# Altium integrated library LEMO Unipole And Multipole Type Connectors.IntLib: 1566 symbols (part 1 of 13) (continued)
## ECG.0B.305.CLV
designator J?
Fixed receptacle with two nuts, with elbow contact for printed circuit (back panel mounting), Key (G), 0B series, Multipole Type with 5 Contacts; Manufacturer: LEMO; PartNumber: ECG.0B.305.CLV; Number of contacts: 5; Contact Diameter: 0.7 mm; AWG: 24; Rated Current(A): 6; DatasheetVersion: Jun-14; PackageReference: ECG.0B.305.CLV; PackageDescription: Fixed receptacle with two nuts, with elbow contact for printed circuit (back panel mounting), Key(G) for Printed Circuit; Supplier 1: Mouser; Supplier Part Number 1: 736-ECG0B305CLV; Supplier 2: Newark; Supplier Part Number 2: 27T7344; Supplier 3: Farnell; Supplier Part Number 3: 9267026; Supplier 4: Digi-Key; Supplier Part Number 4: ECG.0B.305.CLV-ND; ComponentLink1Description: Manufacturer URL; ComponentLink1URL: http://www.lemo.com; ComponentLink2Description: Datasheet; ComponentLink2URL: http://intra.lemo.ch/catalog/ROW/UK_English/unipole_multipole.pdf
footprint ECG.0B.305.CLV (Socket, Female, Body 9mm dia. Height 18.3 mm, Through hole)
pins: 1, 2, 3, 4, 5

## ECG.0B.306.CLN
designator J?
Fixed receptacle with two nuts and straight contact for printed circuit (back panel mounting), Key (G), 0B series, Multipole Type with 6 Contacts; Manufacturer: LEMO; PartNumber: ECG.0B.306.CLN; Number of contacts: 6; Contact Diameter: 0.5 mm; AWG: 28; Rated Current(A): 2.5; DatasheetVersion: Jun-14; PackageReference: ECG.0B.306.CLN; PackageDescription: Fixed receptacle with two nuts and straight contact for printed circuit (back panel mounting), Key(G) for Printed Circuit; Supplier 1: Mouser; Supplier Part Number 1: 736-ECG0B306CLN; Supplier 2: Newark; Supplier Part Number 2: 68R6320; Supplier 3: Digi-Key; Supplier Part Number 3: ECG.0B.306.CLN-ND; ComponentLink1Description: Manufacturer URL; ComponentLink1URL: http://www.lemo.com; ComponentLink2Description: Datasheet; ComponentLink2URL: http://intra.lemo.ch/catalog/ROW/UK_English/unipole_multipole.pdf
footprint ECG.0B.306.CLN (Socket, Female, Body 9mm dia. Height 16.4 mm, Through hole)
pins: 1, 2, 3, 4, 5, 6

## ECG.0B.306.CLV
designator J?
Fixed receptacle with two nuts, with elbow contact for printed circuit (back panel mounting), Key (G), 0B series, Multipole Type with 6 Contacts; Manufacturer: LEMO; PartNumber: ECG.0B.306.CLV; Number of contacts: 6; Contact Diameter: 0.5 mm; AWG: 28; Rated Current(A): 0; DatasheetVersion: Jun-14; PackageReference: ECG.0B.306.CLV; PackageDescription: Fixed receptacle with two nuts, with elbow contact for printed circuit (back panel mounting), Key(G) for Printed Circuit; Supplier 1: Mouser; Supplier Part Number 1: 736-ECG0B306CLV; Supplier 2: Digi-Key; Supplier Part Number 2: ECG.0B.306.CLV-ND; ComponentLink1Description: Manufacturer URL; ComponentLink1URL: http://www.lemo.com; ComponentLink2Description: Datasheet; ComponentLink2URL: http://intra.lemo.ch/catalog/ROW/UK_English/unipole_multipole.pdf
footprint ECG.0B.306.CLV (Socket, Female, Body 9mm dia. Height 18.3 mm, Through hole)
pins: 1, 2, 3, 4, 5, 6

## ECG.0B.307.CLN
designator J?
Fixed receptacle with two nuts and straight contact for printed circuit (back panel mounting), Key (G), 0B series, Multipole Type with 7 Contacts; Manufacturer: LEMO; PartNumber: ECG.0B.307.CLN; Number of contacts: 7; Contact Diameter: 0.5 mm; AWG: 28; Rated Current(A): 2.5; DatasheetVersion: Jun-14; PackageReference: ECG.0B.307.CLN; PackageDescription: Fixed receptacle with two nuts and straight contact for printed circuit (back panel mounting), Key(G) for Printed Circuit; Supplier 1: Mouser; Supplier Part Number 1: 736-ECG0B307CLN; Supplier 2: Newark; Supplier Part Number 2: 25R7474; Supplier 3: Digi-Key; Supplier Part Number 3: 1124-1321-ND; ComponentLink1Description: Manufacturer URL; ComponentLink1URL: http://www.lemo.com; ComponentLink2Description: Datasheet; ComponentLink2URL: http://intra.lemo.ch/catalog/ROW/UK_English/unipole_multipole.pdf
footprint ECG.0B.307.CLN (Socket, Female, Body 9mm dia. Height 16.4 mm, Through hole)
pins: 1, 2, 3, 4, 5, 6, 7

## ECG.0B.307.CLV
designator J?
Fixed receptacle with two nuts, with elbow contact for printed circuit (back panel mounting), Key (G), 0B series, Multipole Type with 7 Contacts; Manufacturer: LEMO; PartNumber: ECG.0B.307.CLV; Number of contacts: 7; Contact Diameter: 0.5 mm; AWG: 28; Rated Current(A): 0; DatasheetVersion: Jun-14; PackageReference: ECG.0B.307.CLV; PackageDescription: Fixed receptacle with two nuts, with elbow contact for printed circuit (back panel mounting), Key(G) for Printed Circuit; Supplier 1: Mouser; Supplier Part Number 1: 736-ECG0B307CLV; Supplier 2: Digi-Key; Supplier Part Number 2: ECG.0B.307.CLV-ND; ComponentLink1Description: Manufacturer URL; ComponentLink1URL: http://www.lemo.com; ComponentLink2Description: Datasheet; ComponentLink2URL: http://intra.lemo.ch/catalog/ROW/UK_English/unipole_multipole.pdf
footprint ECG.0B.307.CLV (Socket, Female, Body 9mm dia. Height 18.3 mm, Through hole)
pins: 1, 2, 3, 4, 5, 6, 7

## ECG.0B.309.CLN
designator J?
Fixed receptacle with two nuts and straight contact for printed circuit (back panel mounting), Key (G), 0B series, Multipole Type with 9 Contacts; Manufacturer: LEMO; PartNumber: ECG.0B.309.CLN; Number of contacts: 9; Contact Diameter: 0.5 mm; AWG: 28; Rated Current(A): 2; DatasheetVersion: Jun-14; PackageReference: ECG.0B.309.CLN; PackageDescription: Fixed receptacle with two nuts and straight contact for printed circuit (back panel mounting), Key(G) for Printed Circuit; Supplier 1: Mouser; Supplier Part Number 1: 736-ECG0B309CLN; Supplier 2: Newark; Supplier Part Number 2: 87R4864; Supplier 3: Digi-Key; Supplier Part Number 3: ECG.0B.309.CLN-ND; ComponentLink1Description: Manufacturer URL; ComponentLink1URL: http://www.lemo.com; ComponentLink2Description: Datasheet; ComponentLink2URL: http://intra.lemo.ch/catalog/ROW/UK_English/unipole_multipole.pdf
footprint ECG.0B.309.CLN (Socket, Female, Body 9mm dia. Height 16.4 mm, Through hole)
pins: 1, 2, 3, 4, 5, 6, 7, 8, 9

## ECG.0B.309.CLV
designator J?
Fixed receptacle with two nuts, with elbow contact for printed circuit (back panel mounting), Key (G), 0B series, Multipole Type with 9 Contacts; Manufacturer: LEMO; PartNumber: ECG.0B.309.CLV; Number of contacts: 9; Contact Diameter: 0.5 mm; AWG: 28; Rated Current(A): 0; DatasheetVersion: Jun-14; PackageReference: ECG.0B.309.CLV; PackageDescription: Fixed receptacle with two nuts, with elbow contact for printed circuit (back panel mounting), Key(G) for Printed Circuit; Supplier 1: Mouser; Supplier Part Number 1: 736-ECG0B309CLV; Supplier 2: Digi-Key; Supplier Part Number 2: ECG.0B.309.CLV-ND; ComponentLink1Description: Manufacturer URL; ComponentLink1URL: http://www.lemo.com; ComponentLink2Description: Datasheet; ComponentLink2URL: http://intra.lemo.ch/catalog/ROW/UK_English/unipole_multipole.pdf
footprint ECG.0B.309.CLV (Socket, Female, Body 9mm dia. Height 18.3 mm, Through hole)
pins: 1, 2, 3, 4, 5, 6, 7, 8, 9

## ECG.1B.302.CLN
designator J?
Fixed receptacle with two nuts and straight contact for printed circuit (back panel mounting), Key (G), 1B series, Multipole Type with 2 Contacts; Manufacturer: LEMO; PartNumber: ECG.1B.302.CLN; Number of contacts: 2; Contact Diameter: 1.3 mm; AWG: 20; Rated Current(A): 15; DatasheetVersion: Jun-14; PackageReference: ECG.1B.302.CLN; PackageDescription: Fixed receptacle with two nuts and straight contact for printed circuit (back panel mounting), Key(G) for Printed Circuit; Supplier 1: Mouser; Supplier Part Number 1: 736-ECG1B302CLN; Supplier 2: Newark; Supplier Part Number 2: 12T6405; Supplier 3: Digi-Key; Supplier Part Number 3: ECG.1B.302.CLN-ND; ComponentLink1Description: Manufacturer URL; ComponentLink1URL: http://www.lemo.com; ComponentLink2Description: Datasheet; ComponentLink2URL: http://intra.lemo.ch/catalog/ROW/UK_English/unipole_multipole.pdf
footprint ECG.1B.302.CLN (Socket, Female, Body 12mm dia. Height 19.8 mm, Through hole)
pins: 1, 2

## ECG.1B.302.CLV
designator J?
Fixed receptacle with two nuts, with elbow contact for printed circuit (back panel mounting), Key (G), 1B series, Multipole Type with 2 Contacts; Manufacturer: LEMO; PartNumber: ECG.1B.302.CLV; Number of contacts: 2; Contact Diameter: 1.3 mm; AWG: 20; Rated Current(A): 12; DatasheetVersion: Jun-14; PackageReference: ECG.1B.302.CLV; PackageDescription: Fixed receptacle with two nuts, with elbow contact for printed circuit (back panel mounting), Key(G) for Printed Circuit; Supplier 1: Mouser; Supplier Part Number 1: 736-ECG1B302CLV; Supplier 2: Digi-Key; Supplier Part Number 2: ECG.1B.302.CLV-ND; ComponentLink1Description: Manufacturer URL; ComponentLink1URL: http://www.lemo.com; ComponentLink2Description: Datasheet; ComponentLink2URL: http://intra.lemo.ch/catalog/ROW/UK_English/unipole_multipole.pdf
footprint ECG.1B.302.CLV (Socket, Female, Body 12mm dia. Height 20.3 mm, Through hole)
pins: 1, 2

## ECG.1B.303.CLN
designator J?
Fixed receptacle with two nuts and straight contact for printed circuit (back panel mounting), Key (G), 1B series, Multipole Type with 3 Contacts; Manufacturer: LEMO; PartNumber: ECG.1B.303.CLN; Number of contacts: 3; Contact Diameter: 1.3 mm; AWG: 20; Rated Current(A): 12; DatasheetVersion: Jun-14; PackageReference: ECG.1B.303.CLN; PackageDescription: Fixed receptacle with two nuts and straight contact for printed circuit (back panel mounting), Key(G) for Printed Circuit; Supplier 1: Mouser; Supplier Part Number 1: 736-ECG1B303CLN; Supplier 2: Digi-Key; Supplier Part Number 2: ECG.1B.303.CLN-ND; ComponentLink1Description: Manufacturer URL; ComponentLink1URL: http://www.lemo.com; ComponentLink2Description: Datasheet; ComponentLink2URL: http://intra.lemo.ch/catalog/ROW/UK_English/unipole_multipole.pdf
footprint ECG.1B.303.CLN (Socket, Female, Body 12mm dia. Height 19.8 mm, Through hole)
pins: 1, 2, 3

## ECG.1B.303.CLV
designator J?
Fixed receptacle with two nuts, with elbow contact for printed circuit (back panel mounting), Key (G), 1B series, Multipole Type with 3 Contacts; Manufacturer: LEMO; PartNumber: ECG.1B.303.CLV; Number of contacts: 3; Contact Diameter: 1.3 mm; AWG: 20; Rated Current(A): 0; DatasheetVersion: Jun-14; PackageReference: ECG.1B.303.CLV; PackageDescription: Fixed receptacle with two nuts, with elbow contact for printed circuit (back panel mounting), Key(G) for Printed Circuit; Supplier 1: Mouser; Supplier Part Number 1: 736-ECG1B303CLV; Supplier 2: Farnell; Supplier Part Number 2: 9267034; Supplier 3: Digi-Key; Supplier Part Number 3: ECG.1B.303.CLV-ND; ComponentLink1Description: Manufacturer URL; ComponentLink1URL: http://www.lemo.com; ComponentLink2Description: Datasheet; ComponentLink2URL: http://intra.lemo.ch/catalog/ROW/UK_English/unipole_multipole.pdf
footprint ECG.1B.303.CLV (Socket, Female, Body 12mm dia. Height 20.3 mm, Through hole)
pins: 1, 2, 3

## ECG.1B.304.CLN
designator J?
Fixed receptacle with two nuts and straight contact for printed circuit (back panel mounting), Key (G), 1B series, Multipole Type with 4 Contacts; Manufacturer: LEMO; PartNumber: ECG.1B.304.CLN; Number of contacts: 4; Contact Diameter: 0.9 mm; AWG: 22; Rated Current(A): 10; DatasheetVersion: Jun-14; PackageReference: ECG.1B.304.CLN; PackageDescription: Fixed receptacle with two nuts and straight contact for printed circuit (back panel mounting), Key(G) for Printed Circuit; Supplier 1: Mouser; Supplier Part Number 1: 736-ECG1B304CLN; Supplier 2: Newark; Supplier Part Number 2: 68R6325; Supplier 3: Digi-Key; Supplier Part Number 3: ECG.1B.304.CLN-ND; ComponentLink1Description: Manufacturer URL; ComponentLink1URL: http://www.lemo.com; ComponentLink2Description: Datasheet; ComponentLink2URL: http://intra.lemo.ch/catalog/ROW/UK_English/unipole_multipole.pdf
footprint ECG.1B.304.CLN (Socket, Female, Body 12mm dia. Height 19.8 mm, Through hole)
pins: 1, 2, 3, 4

## ECG.1B.304.CLV
designator J?
Fixed receptacle with two nuts, with elbow contact for printed circuit (back panel mounting), Key (G), 1B series, Multipole Type with 4 Contacts; Manufacturer: LEMO; PartNumber: ECG.1B.304.CLV; Number of contacts: 4; Contact Diameter: 0.9 mm; AWG: 22; Rated Current(A): 6; DatasheetVersion: Jun-14; PackageReference: ECG.1B.304.CLV; PackageDescription: Fixed receptacle with two nuts, with elbow contact for printed circuit (back panel mounting), Key(G) for Printed Circuit; Supplier 1: Mouser; Supplier Part Number 1: 736-ECG1B304CLV; Supplier 2: Farnell; Supplier Part Number 2: 9267042; Supplier 3: Digi-Key; Supplier Part Number 3: ECG.1B.304.CLV-ND; ComponentLink1Description: Manufacturer URL; ComponentLink1URL: http://www.lemo.com; ComponentLink2Description: Datasheet; ComponentLink2URL: http://intra.lemo.ch/catalog/ROW/UK_English/unipole_multipole.pdf
footprint ECG.1B.304.CLV (Socket, Female, Body 12mm dia. Height 20.3 mm, Through hole)
pins: 1, 2, 3, 4

## ECG.1B.305.CLN
designator J?
Fixed receptacle with two nuts and straight contact for printed circuit (back panel mounting), Key (G), 1B series, Multipole Type with 5 Contacts; Manufacturer: LEMO; PartNumber: ECG.1B.305.CLN; Number of contacts: 5; Contact Diameter: 0.9 mm; AWG: 22; Rated Current(A): 9; DatasheetVersion: Jun-14; PackageReference: ECG.1B.305.CLN; PackageDescription: Fixed receptacle with two nuts and straight contact for printed circuit (back panel mounting), Key(G) for Printed Circuit; Supplier 1: Mouser; Supplier Part Number 1: 736-ECG1B305CLN; Supplier 2: Newark; Supplier Part Number 2: 25R7475; Supplier 3: Digi-Key; Supplier Part Number 3: ECG.1B.305.CLN-ND; ComponentLink1Description: Manufacturer URL; ComponentLink1URL: http://www.lemo.com; ComponentLink2Description: Datasheet; ComponentLink2URL: http://intra.lemo.ch/catalog/ROW/UK_English/unipole_multipole.pdf
footprint ECG.1B.305.CLN (Socket, Female, Body 12mm dia. Height 19.8 mm, Through hole)
pins: 1, 2, 3, 4, 5

## ECG.1B.305.CLV
designator J?
Fixed receptacle with two nuts, with elbow contact for printed circuit (back panel mounting), Key (G), 1B series, Multipole Type with 5 Contacts; Manufacturer: LEMO; PartNumber: ECG.1B.305.CLV; Number of contacts: 5; Contact Diameter: 0.9 mm; AWG: 22; Rated Current(A): 6; DatasheetVersion: Jun-14; PackageReference: ECG.1B.305.CLV; PackageDescription: Fixed receptacle with two nuts, with elbow contact for printed circuit (back panel mounting), Key(G) for Printed Circuit; Supplier 1: Mouser; Supplier Part Number 1: 736-ECG1B305CLV; Supplier 2: Digi-Key; Supplier Part Number 2: ECG.1B.305.CLV-ND; ComponentLink1Description: Manufacturer URL; ComponentLink1URL: http://www.lemo.com; ComponentLink2Description: Datasheet; ComponentLink2URL: http://intra.lemo.ch/catalog/ROW/UK_English/unipole_multipole.pdf
footprint ECG.1B.305.CLV (Socket, Female, Body 12mm dia. Height 20.3 mm, Through hole)
pins: 1, 2, 3, 4, 5

## ECG.1B.306.CLN
designator J?
Fixed receptacle with two nuts and straight contact for printed circuit (back panel mounting), Key (G), 1B series, Multipole Type with 6 Contacts; Manufacturer: LEMO; PartNumber: ECG.1B.306.CLN; Number of contacts: 6; Contact Diameter: 0.7 mm; AWG: 24; Rated Current(A): 7; DatasheetVersion: Jun-14; PackageReference: ECG.1B.306.CLN; PackageDescription: Fixed receptacle with two nuts and straight contact for printed circuit (back panel mounting), Key(G) for Printed Circuit; Supplier 1: Mouser; Supplier Part Number 1: 736-ECG1B306CLN; Supplier 2: Newark; Supplier Part Number 2: 12T6407; Supplier 3: Digi-Key; Supplier Part Number 3: ECG.1B.306.CLN-ND; ComponentLink1Description: Manufacturer URL; ComponentLink1URL: http://www.lemo.com; ComponentLink2Description: Datasheet; ComponentLink2URL: http://intra.lemo.ch/catalog/ROW/UK_English/unipole_multipole.pdf
footprint ECG.1B.306.CLN (Socket, Female, Body 12mm dia. Height 19.8 mm, Through hole)
pins: 1, 2, 3, 4, 5, 6

## ECG.1B.306.CLV
designator J?
Fixed receptacle with two nuts, with elbow contact for printed circuit (back panel mounting), Key (G), 1B series, Multipole Type with 6 Contacts; Manufacturer: LEMO; PartNumber: ECG.1B.306.CLV; Number of contacts: 6; Contact Diameter: 0.7 mm; AWG: 24; DatasheetVersion: Jun-14; PackageReference: ECG.1B.306.CLV; PackageDescription: Fixed receptacle with two nuts, with elbow contact for printed circuit (back panel mounting), Key(G) for Printed Circuit; Supplier 1: Mouser; Supplier Part Number 1: 736-ECG1B306CLV; Supplier 2: Farnell; Supplier Part Number 2: 9267050; Supplier 3: Digi-Key; Supplier Part Number 3: 1124-1324-ND; Rated Current(A): 6; ComponentLink1Description: Manufacturer URL; ComponentLink1URL: http://www.lemo.com; ComponentLink2Description: Datasheet; ComponentLink2URL: http://intra.lemo.ch/catalog/ROW/UK_English/unipole_multipole.pdf
footprint ECG.1B.306.CLV (Socket, Female, Body 12mm dia. Height 20.3 mm, Through hole)
pins: 1, 2, 3, 4, 5, 6

## ECG.1B.307.CLN
designator J?
Fixed receptacle with two nuts and straight contact for printed circuit (back panel mounting), Key (G), 1B series, Multipole Type with 7 Contacts; Manufacturer: LEMO; PartNumber: ECG.1B.307.CLN; Number of contacts: 7; Contact Diameter: 0.7 mm; AWG: 24; DatasheetVersion: Jun-14; PackageReference: ECG.1B.307.CLN; PackageDescription: Fixed receptacle with two nuts and straight contact for printed circuit (back panel mounting), Key(G) for Printed Circuit; Supplier 1: Mouser; Supplier Part Number 1: 736-ECG1B307CLN; Supplier 2: Newark; Supplier Part Number 2: 80R0501; Supplier 3: Digi-Key; Supplier Part Number 3: 1124-1325-ND; Rated Current(A): 7; ComponentLink1Description: Manufacturer URL; ComponentLink1URL: http://www.lemo.com; ComponentLink2Description: Datasheet; ComponentLink2URL: http://intra.lemo.ch/catalog/ROW/UK_English/unipole_multipole.pdf
footprint ECG.1B.307.CLN (Socket, Female, Body 12mm dia. Height 19.8 mm, Through hole)
pins: 1, 2, 3, 4, 5, 6, 7

## ECG.1B.307.CLV
designator J?
Fixed receptacle with two nuts, with elbow contact for printed circuit (back panel mounting), Key (G), 1B series, Multipole Type with 7 Contacts; Manufacturer: LEMO; PartNumber: ECG.1B.307.CLV; Number of contacts: 7; Contact Diameter: 0.7 mm; AWG: 24; Rated Current(A): 6; DatasheetVersion: Jun-14; PackageReference: ECG.1B.307.CLV; PackageDescription: Fixed receptacle with two nuts, with elbow contact for printed circuit (back panel mounting), Key(G) for Printed Circuit; Supplier 1: Mouser; Supplier Part Number 1: 736-ECG1B307CLV; Supplier 2: Digi-Key; Supplier Part Number 2: ECG.1B.307.CLV-ND; ComponentLink1Description: Manufacturer URL; ComponentLink1URL: http://www.lemo.com; ComponentLink2Description: Datasheet; ComponentLink2URL: http://intra.lemo.ch/catalog/ROW/UK_English/unipole_multipole.pdf
footprint ECG.1B.307.CLV (Socket, Female, Body 12mm dia. Height 20.3 mm, Through hole)
pins: 1, 2, 3, 4, 5, 6, 7

## ECG.1B.308.CLN
designator J?
Fixed receptacle with two nuts and straight contact for printed circuit (back panel mounting), Key (G), 1B series, Multipole Type with 8 Contacts; Manufacturer: LEMO; PartNumber: ECG.1B.308.CLN; Number of contacts: 8; Contact Diameter: 0.7 mm; AWG: 24; Rated Current(A): 5; DatasheetVersion: Jun-14; PackageReference: ECG.1B.308.CLN; PackageDescription: Fixed receptacle with two nuts and straight contact for printed circuit (back panel mounting), Key(G) for Printed Circuit; Supplier 1: Mouser; Supplier Part Number 1: 736-ECG1B308CLN; Supplier 2: Newark; Supplier Part Number 2: 68R6330; Supplier 3: Digi-Key; Supplier Part Number 3: 1124-1326-ND; ComponentLink1Description: Manufacturer URL; ComponentLink1URL: http://www.lemo.com; ComponentLink2Description: Datasheet; ComponentLink2URL: http://intra.lemo.ch/catalog/ROW/UK_English/unipole_multipole.pdf
footprint ECG.1B.308.CLN (Socket, Female, Body 12mm dia. Height 19.8 mm, Through hole)
pins: 1, 2, 3, 4, 5, 6, 7, 8

## ECG.1B.308.CLV
designator J?
Fixed receptacle with two nuts, with elbow contact for printed circuit (back panel mounting), Key (G), 1B series, Multipole Type with 8 Contacts; Manufacturer: LEMO; PartNumber: ECG.1B.308.CLV; Number of contacts: 8; Contact Diameter: 0.7 mm; AWG: 24; Rated Current(A): 0; DatasheetVersion: Jun-14; PackageReference: ECG.1B.308.CLV; PackageDescription: Fixed receptacle with two nuts, with elbow contact for printed circuit (back panel mounting), Key(G) for Printed Circuit; Supplier 1: Mouser; Supplier Part Number 1: 736-ECG1B308CLV; Supplier 2: Digi-Key; Supplier Part Number 2: ECG.1B.308.CLV-ND; ComponentLink1Description: Manufacturer URL; ComponentLink1URL: http://www.lemo.com; ComponentLink2Description: Datasheet; ComponentLink2URL: http://intra.lemo.ch/catalog/ROW/UK_English/unipole_multipole.pdf
footprint ECG.1B.308.CLV (Socket, Female, Body 12mm dia. Height 20.3 mm, Through hole)
pins: 1, 2, 3, 4, 5, 6, 7, 8

## ECG.1B.310.CLN
designator J?
Fixed receptacle with two nuts and straight contact for printed circuit (back panel mounting), Key (G), 1B series, Multipole Type with 10 Contacts; Manufacturer: LEMO; PartNumber: ECG.1B.310.CLN; Number of contacts: 10; Contact Diameter: 0.5 mm; AWG: 28; Rated Current(A): 2.5; DatasheetVersion: Jun-14; PackageReference: ECG.1B.310.CLN; PackageDescription: Fixed receptacle with two nuts and straight contact for printed circuit (back panel mounting), Key(G) for Printed Circuit; Supplier 1: Mouser; Supplier Part Number 1: 736-ECG1B310CLN; Supplier 2: Newark; Supplier Part Number 2: 68R6331; Supplier 3: Digi-Key; Supplier Part Number 3: ECG.1B.310.CLN-ND; ComponentLink1Description: Manufacturer URL; ComponentLink1URL: http://www.lemo.com; ComponentLink2Description: Datasheet; ComponentLink2URL: http://intra.lemo.ch/catalog/ROW/UK_English/unipole_multipole.pdf
footprint ECG.1B.310.CLN (Socket, Female, Body 12mm dia. Height 19.8 mm, Through hole)
pins: 1, 2, 3, 4, 5, 6, 7, 8, 9, 10

## ECG.1B.314.CLN
designator J?
Fixed receptacle with two nuts and straight contact for printed circuit (back panel mounting), Key (G), 1B series, Multipole Type with 14 Contacts; Manufacturer: LEMO; PartNumber: ECG.1B.314.CLN; Number of contacts: 14; Contact Diameter: 0.5 mm; AWG: 28; Rated Current(A): 2; DatasheetVersion: Jun-14; PackageReference: ECG.1B.314.CLN; PackageDescription: Fixed receptacle with two nuts and straight contact for printed circuit (back panel mounting), Key(G) for Printed Circuit; Supplier 1: Mouser; Supplier Part Number 1: 736-ECG1B314CLN; Supplier 2: Digi-Key; Supplier Part Number 2: ECG.1B.314.CLN-ND; ComponentLink1Description: Manufacturer URL; ComponentLink1URL: http://www.lemo.com; ComponentLink2Description: Datasheet; ComponentLink2URL: http://intra.lemo.ch/catalog/ROW/UK_English/unipole_multipole.pdf
footprint ECG.1B.314.CLN (Socket, Female, Body 12mm dia. Height 19.8 mm, Through hole)
pins: 1, 2, 3, 4, 5, 6, 7, 8, 9, 10, 11, 12, 13, 14

## ECG.1B.316.CLN
designator J?
Fixed receptacle with two nuts and straight contact for printed circuit (back panel mounting), Key (G), 1B series, Multipole Type with 16 Contacts; Manufacturer: LEMO; PartNumber: ECG.1B.316.CLN; Number of contacts: 16; Contact Diameter: 0.5 mm; AWG: 28; Rated Current(A): 1.5; DatasheetVersion: Jun-14; PackageReference: ECG.1B.316.CLN; PackageDescription: Fixed receptacle with two nuts and straight contact for printed circuit (back panel mounting), Key(G) for Printed Circuit; Supplier 1: Mouser; Supplier Part Number 1: 736-ECG1B316CLN; Supplier 2: Digi-Key; Supplier Part Number 2: ECG.1B.316.CLN-ND; ComponentLink1Description: Manufacturer URL; ComponentLink1URL: http://www.lemo.com; ComponentLink2Description: Datasheet; ComponentLink2URL: http://intra.lemo.ch/catalog/ROW/UK_English/unipole_multipole.pdf
footprint ECG.1B.316.CLN (Socket, Female, Body 12mm dia. Height 19.8 mm, Through hole)
pins: 1, 2, 3, 4, 5, 6, 7, 8, 9, 10, 11, 12, 13, 14, 15, 16

## ECG.2B.302.CLN
designator J?
Fixed receptacle with two nuts and straight contact for printed circuit (back panel mounting), Key (G), 2B series, Multipole Type with 2 Contacts; Manufacturer: LEMO; PartNumber: ECG.2B.302.CLN; Number of contacts: 2; Contact Diameter: 2 mm; AWG: 14; Rated Current(A): 25; DatasheetVersion: Jun-14; PackageReference: ECG.2B.302.CLN; PackageDescription: Fixed receptacle with two nuts and straight contact for printed circuit (back panel mounting), Key(G) for Printed Circuit; Supplier 1: Mouser; Supplier Part Number 1: 736-ECG2B302CLN; Supplier 2: Digi-Key; Supplier Part Number 2: ECG.2B.302.CLN-ND; ComponentLink1Description: Manufacturer URL; ComponentLink1URL: http://www.lemo.com; ComponentLink2Description: Datasheet; ComponentLink2URL: http://intra.lemo.ch/catalog/ROW/UK_English/unipole_multipole.pdf
footprint ECG.2B.302.CLN (Socket, Female, Body 15mm dia. Height 21.8 mm, Through hole)
pins: 1, 2

## ECG.2B.302.CLV
designator J?
Fixed receptacle with two nuts, with elbow contact for printed circuit (back panel mounting), Key (G), 2B series, Multipole Type with 2 Contacts; Manufacturer: LEMO; PartNumber: ECG.2B.302.CLV; Number of contacts: 2; Contact Diameter: 2 mm; AWG: 14; Rated Current(A): 12; DatasheetVersion: Jun-14; PackageReference: ECG.2B.302.CLV; PackageDescription: Fixed receptacle with two nuts, with elbow contact for printed circuit (back panel mounting), Key(G) for Printed Circuit; Supplier 1: Mouser; Supplier Part Number 1: 736-ECG2B302CLV; Supplier 2: Digi-Key; Supplier Part Number 2: ECG.2B.302.CLV-ND; ComponentLink1Description: Manufacturer URL; ComponentLink1URL: http://www.lemo.com; ComponentLink2Description: Datasheet; ComponentLink2URL: http://intra.lemo.ch/catalog/ROW/UK_English/unipole_multipole.pdf
footprint ECG.2B.302.CLV (Socket, Female, Body 15mm dia. Height 22.3 mm, Through hole)
pins: 1, 2

## ECG.2B.303.CLN
designator J?
Fixed receptacle with two nuts and straight contact for printed circuit (back panel mounting), Key (G), 2B series, Multipole Type with 3 Contacts; Manufacturer: LEMO; PartNumber: ECG.2B.303.CLN; Number of contacts: 3; Contact Diameter: 1.6 mm; AWG: 16; Rated Current(A): 17; DatasheetVersion: Jun-14; PackageReference: ECG.2B.303.CLN; PackageDescription: Fixed receptacle with two nuts and straight contact for printed circuit (back panel mounting), Key(G) for Printed Circuit; Supplier 1: Mouser; Supplier Part Number 1: 736-ECG2B303CLN; Supplier 2: Digi-Key; Supplier Part Number 2: ECG.2B.303.CLN-ND; ComponentLink1Description: Manufacturer URL; ComponentLink1URL: http://www.lemo.com; ComponentLink2Description: Datasheet; ComponentLink2URL: http://intra.lemo.ch/catalog/ROW/UK_English/unipole_multipole.pdf
footprint ECG.2B.303.CLN (Socket, Female, Body 15mm dia. Height 21.8 mm, Through hole)
pins: 1, 2, 3

## ECG.2B.303.CLV
designator J?
Fixed receptacle with two nuts, with elbow contact for printed circuit (back panel mounting), Key (G), 2B series, Multipole Type with 3 Contacts; Manufacturer: LEMO; PartNumber: ECG.2B.303.CLV; Number of contacts: 3; Contact Diameter: 1.6 mm; AWG: 16; Rated Current(A): 12; DatasheetVersion: Jun-14; PackageReference: ECG.2B.303.CLV; PackageDescription: Fixed receptacle with two nuts, with elbow contact for printed circuit (back panel mounting), Key(G) for Printed Circuit; Supplier 1: Mouser; Supplier Part Number 1: 736-ECG2B303CLV; Supplier 2: Digi-Key; Supplier Part Number 2: ECG.2B.303.CLV-ND; ComponentLink1Description: Manufacturer URL; ComponentLink1URL: http://www.lemo.com; ComponentLink2Description: Datasheet; ComponentLink2URL: http://intra.lemo.ch/catalog/ROW/UK_English/unipole_multipole.pdf
footprint ECG.2B.303.CLV (Socket, Female, Body 15mm dia. Height 22.3 mm, Through hole)
pins: 1, 2, 3

## ECG.2B.304.CLN
designator J?
Fixed receptacle with two nuts and straight contact for printed circuit (back panel mounting), Key (G), 2B series, Multipole Type with 4 Contacts; Manufacturer: LEMO; PartNumber: ECG.2B.304.CLN; Number of contacts: 4; Contact Diameter: 1.3 mm; AWG: 20; Rated Current(A): 15; DatasheetVersion: Jun-14; PackageReference: ECG.2B.304.CLN; PackageDescription: Fixed receptacle with two nuts and straight contact for printed circuit (back panel mounting), Key(G) for Printed Circuit; Supplier 1: Mouser; Supplier Part Number 1: 736-ECG2B304CLN; Supplier 2: Digi-Key; Supplier Part Number 2: ECG.2B.304.CLN-ND; ComponentLink1Description: Manufacturer URL; ComponentLink1URL: http://www.lemo.com; ComponentLink2Description: Datasheet; ComponentLink2URL: http://intra.lemo.ch/catalog/ROW/UK_English/unipole_multipole.pdf
footprint ECG.2B.304.CLN (Socket, Female, Body 15mm dia. Height 21.8 mm, Through hole)
pins: 1, 2, 3, 4

## ECG.2B.304.CLV
designator J?
Fixed receptacle with two nuts, with elbow contact for printed circuit (back panel mounting), Key (G), 2B series, Multipole Type with 4 Contacts; Manufacturer: LEMO; PartNumber: ECG.2B.304.CLV; Number of contacts: 4; Contact Diameter: 1.3 mm; AWG: 20; Rated Current(A): 0; DatasheetVersion: Jun-14; PackageReference: ECG.2B.304.CLV; PackageDescription: Fixed receptacle with two nuts, with elbow contact for printed circuit (back panel mounting), Key(G) for Printed Circuit; Supplier 1: Mouser; Supplier Part Number 1: 736-ECG2B304CLV; Supplier 2: Digi-Key; Supplier Part Number 2: ECG.2B.304.CLV-ND; ComponentLink1Description: Manufacturer URL; ComponentLink1URL: http://www.lemo.com; ComponentLink2Description: Datasheet; ComponentLink2URL: http://intra.lemo.ch/catalog/ROW/UK_English/unipole_multipole.pdf
footprint ECG.2B.304.CLV (Socket, Female, Body 15mm dia. Height 22.3 mm, Through hole)
pins: 1, 2, 3, 4

## ECG.2B.305.CLN
designator J?
Fixed receptacle with two nuts and straight contact for printed circuit (back panel mounting), Key (G), 2B series, Multipole Type with 5 Contacts; Manufacturer: LEMO; PartNumber: ECG.2B.305.CLN; Number of contacts: 5; Contact Diameter: 1.3 mm; AWG: 20; Rated Current(A): 14; DatasheetVersion: Jun-14; PackageReference: ECG.2B.305.CLN; PackageDescription: Fixed receptacle with two nuts and straight contact for printed circuit (back panel mounting), Key(G) for Printed Circuit; Supplier 1: Mouser; Supplier Part Number 1: 736-ECG2B305CLN; Supplier 2: Digi-Key; Supplier Part Number 2: ECG.2B.305.CLN-ND; ComponentLink1Description: Manufacturer URL; ComponentLink1URL: http://www.lemo.com; ComponentLink2Description: Datasheet; ComponentLink2URL: http://intra.lemo.ch/catalog/ROW/UK_English/unipole_multipole.pdf
footprint ECG.2B.305.CLN (Socket, Female, Body 15mm dia. Height 21.8 mm, Through hole)
pins: 1, 2, 3, 4, 5

## ECG.2B.305.CLV
designator J?
Fixed receptacle with two nuts, with elbow contact for printed circuit (back panel mounting), Key (G), 2B series, Multipole Type with 5 Contacts; Manufacturer: LEMO; PartNumber: ECG.2B.305.CLV; Number of contacts: 5; Contact Diameter: 1.3 mm; AWG: 20; Rated Current(A): 0; DatasheetVersion: Jun-14; PackageReference: ECG.2B.305.CLV; PackageDescription: Fixed receptacle with two nuts, with elbow contact for printed circuit (back panel mounting), Key(G) for Printed Circuit; Supplier 1: Mouser; Supplier Part Number 1: 736-ECG2B305CLV; Supplier 2: Digi-Key; Supplier Part Number 2: ECG.2B.305.CLV-ND; ComponentLink1Description: Manufacturer URL; ComponentLink1URL: http://www.lemo.com; ComponentLink2Description: Datasheet; ComponentLink2URL: http://intra.lemo.ch/catalog/ROW/UK_English/unipole_multipole.pdf
footprint ECG.2B.305.CLV (Socket, Female, Body 15mm dia. Height 22.3 mm, Through hole)
pins: 1, 2, 3, 4, 5

## ECG.2B.306.CLN
designator J?
Fixed receptacle with two nuts and straight contact for printed circuit (back panel mounting), Key (G), 2B series, Multipole Type with 6 Contacts; Manufacturer: LEMO; PartNumber: ECG.2B.306.CLN; Number of contacts: 6; Contact Diameter: 1.3 mm; AWG: 20; Rated Current(A): 12; DatasheetVersion: Jun-14; PackageReference: ECG.2B.306.CLN; PackageDescription: Fixed receptacle with two nuts and straight contact for printed circuit (back panel mounting), Key(G) for Printed Circuit; Supplier 1: Mouser; Supplier Part Number 1: 736-ECG2B306CLN; Supplier 2: Newark; Supplier Part Number 2: 90T4974; Supplier 3: Digi-Key; Supplier Part Number 3: ECG.2B.306.CLN-ND; ComponentLink1Description: Manufacturer URL; ComponentLink1URL: http://www.lemo.com; ComponentLink2Description: Datasheet; ComponentLink2URL: http://intra.lemo.ch/catalog/ROW/UK_English/unipole_multipole.pdf
footprint ECG.2B.306.CLN (Socket, Female, Body 15mm dia. Height 21.8 mm, Through hole)
pins: 1, 2, 3, 4, 5, 6

## ECG.2B.306.CLV
designator J?
Fixed receptacle with two nuts, with elbow contact for printed circuit (back panel mounting), Key (G), 2B series, Multipole Type with 6 Contacts; Manufacturer: LEMO; PartNumber: ECG.2B.306.CLV; Number of contacts: 6; Contact Diameter: 1.3 mm; AWG: 20; Rated Current(A): 0; DatasheetVersion: Jun-14; PackageReference: ECG.2B.306.CLV; PackageDescription: Fixed receptacle with two nuts, with elbow contact for printed circuit (back panel mounting), Key(G) for Printed Circuit; Supplier 1: Mouser; Supplier Part Number 1: 736-ECG2B306CLV; Supplier 2: Digi-Key; Supplier Part Number 2: ECG.2B.306.CLV-ND; ComponentLink1Description: Manufacturer URL; ComponentLink1URL: http://www.lemo.com; ComponentLink2Description: Datasheet; ComponentLink2URL: http://intra.lemo.ch/catalog/ROW/UK_English/unipole_multipole.pdf
footprint ECG.2B.306.CLV (Socket, Female, Body 15mm dia. Height 22.3 mm, Through hole)
pins: 1, 2, 3, 4, 5, 6

## ECG.2B.307.CLN
designator J?
Fixed receptacle with two nuts and straight contact for printed circuit (back panel mounting), Key (G), 2B series, Multipole Type with 7 Contacts; Manufacturer: LEMO; PartNumber: ECG.2B.307.CLN; Number of contacts: 7; Contact Diameter: 1.3 mm; AWG: 20; Rated Current(A): 11; DatasheetVersion: Jun-14; PackageReference: ECG.2B.307.CLN; PackageDescription: Fixed receptacle with two nuts and straight contact for printed circuit (back panel mounting), Key(G) for Printed Circuit; Supplier 1: Mouser; Supplier Part Number 1: 736-ECG2B307CLN; Supplier 2: Digi-Key; Supplier Part Number 2: ECG.2B.307.CLN-ND; ComponentLink1Description: Manufacturer URL; ComponentLink1URL: http://www.lemo.com; ComponentLink2Description: Datasheet; ComponentLink2URL: http://intra.lemo.ch/catalog/ROW/UK_English/unipole_multipole.pdf
footprint ECG.2B.307.CLN (Socket, Female, Body 15mm dia. Height 21.8 mm, Through hole)
pins: 1, 2, 3, 4, 5, 6, 7

## ECG.2B.307.CLV
designator J?
Fixed receptacle with two nuts, with elbow contact for printed circuit (back panel mounting), Key (G), 2B series, Multipole Type with 7 Contacts; Manufacturer: LEMO; PartNumber: ECG.2B.307.CLV; Number of contacts: 7; Contact Diameter: 1.3 mm; AWG: 20; Rated Current(A): 0; DatasheetVersion: Jun-14; PackageReference: ECG.2B.307.CLV; PackageDescription: Fixed receptacle with two nuts, with elbow contact for printed circuit (back panel mounting), Key(G) for Printed Circuit; Supplier 1: Mouser; Supplier Part Number 1: 736-ECG2B307CLV; Supplier 2: Digi-Key; Supplier Part Number 2: ECG.2B.307.CLV-ND; ComponentLink1Description: Manufacturer URL; ComponentLink1URL: http://www.lemo.com; ComponentLink2Description: Datasheet; ComponentLink2URL: http://intra.lemo.ch/catalog/ROW/UK_English/unipole_multipole.pdf
footprint ECG.2B.307.CLV (Socket, Female, Body 15mm dia. Height 22.3 mm, Through hole)
pins: 1, 2, 3, 4, 5, 6, 7